# Altium schematic symbol library con-garry (Version 2).SCHLIB: 610 symbols (part 10 of 21)

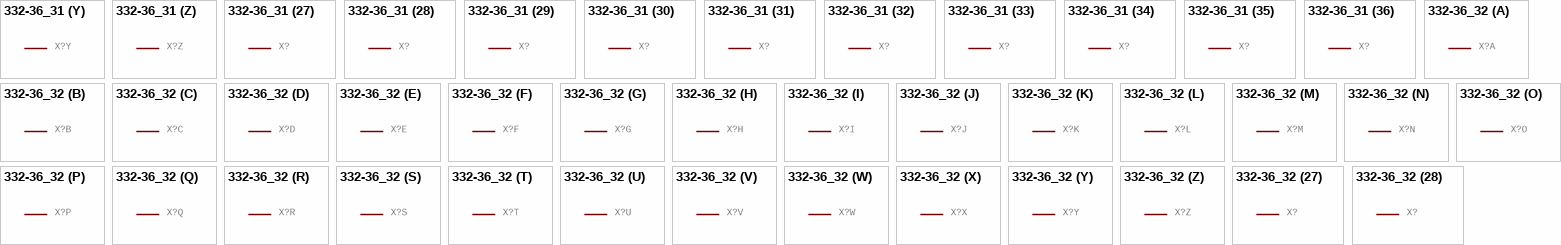
[diagram p207: symbols 332-36_31 to 332-36_32]

## 332-36_31
designator X?, comment 36 Pin - 2mm Dual Row   Source: www.mpe-connector.de / garry_shortform_2012.pdf  (value not drawn)
GateName_1: -1; SymbolName_1: MV; GateName_2: -2; GateName_3: -3; SymbolName_3: M; GateName_4: -4; GateName_5: -5; GateName_6: -6; GateName_7: -7; GateName_8: -8; GateName_9: -9; GateName_10: -10; GateName_11: -11; GateName_12: -12; GateName_13: -13; GateName_14: -14; GateName_15: -15; GateName_16: -16; GateName_17: -17; GateName_18: -18; GateName_19: -19; GateName_20: -20; GateName_21: -21; GateName_22: -22; GateName_23: -23; GateName_24: -24; GateName_25: -25; GateName_26: -26; GateName_27: -27; GateName_28: -28; GateName_29: -29; GateName_30: -30; GateName_31: -31; GateName_32: -32; GateName_33: -33; GateName_34: -34; GateName_35: -35; GateName_36: -36; DeviceSetName: 332-36; POPULARITY: 0; SymbolName_2: MV; SymbolName_4: M; SymbolName_5: M; SymbolName_6: M; SymbolName_7: M; SymbolName_8: M; SymbolName_9: M; SymbolName_10: M; SymbolName_11: M; SymbolName_12: M; SymbolName_13: M; SymbolName_14: M; SymbolName_15: M; SymbolName_16: M; SymbolName_17: M; SymbolName_18: M; SymbolName_19: M; SymbolName_20: M; SymbolName_21: M; SymbolName_22: M; SymbolName_23: M; SymbolName_24: M; SymbolName_25: M; SymbolName_26: M; SymbolName_27: M; SymbolName_28: M; SymbolName_29: M; SymbolName_30: M; SymbolName_31: M; SymbolName_32: M; SymbolName_33: M; SymbolName_34: M; SymbolName_35: M; SymbolName_36: M; LibraryName: con-garry (Version 2); Package: 332-36
footprint 332-36
part A pins: 1 S
part B pins: 2 S
part C pins: 3 S
part D pins: 4 S
part E pins: 5 S
part F pins: 6 S
part G pins: 7 S
part H pins: 8 S
part I pins: 9 S
part J pins: 10 S
part K pins: 11 S
part L pins: 12 S
part M pins: 13 S
part N pins: 14 S
part O pins: 15 S
part P pins: 16 S
part Q pins: 17 S
part R pins: 18 S
part S pins: 19 S
part T pins: 20 S
part U pins: 21 S
part V pins: 22 S
part W pins: 23 S
part X pins: 24 S
part Y pins: 25 S
part Z pins: 26 S
part 27 pins: 27 S
part 28 pins: 28 S
part 29 pins: 29 S
part 30 pins: 30 S
part 31 pins: 31 S
part 32 pins: 32 S
part 33 pins: 33 S
part 34 pins: 34 S
part 35 pins: 35 S
part 36 pins: 36 S

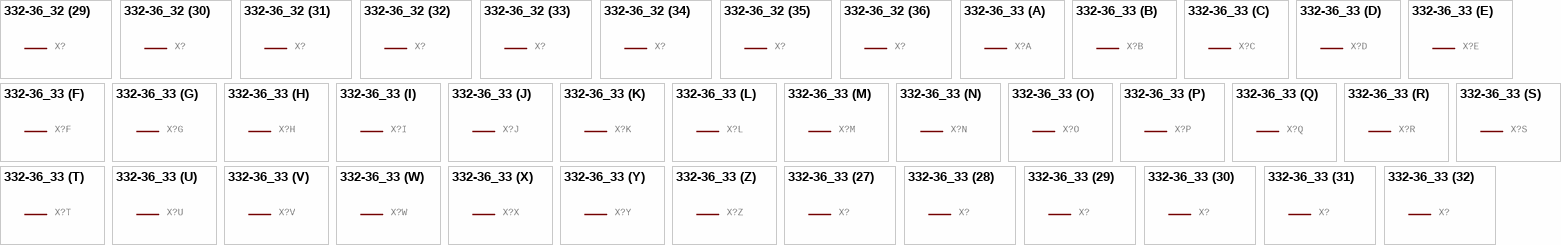
[diagram p208: symbols 332-36_32 to 332-36_33]

## 332-36_32
designator X?, comment 36 Pin - 2mm Dual Row   Source: www.mpe-connector.de / garry_shortform_2012.pdf  (value not drawn)
GateName_1: -1; SymbolName_1: MV; GateName_2: -2; GateName_3: -3; SymbolName_3: M; GateName_4: -4; GateName_5: -5; GateName_6: -6; GateName_7: -7; GateName_8: -8; GateName_9: -9; GateName_10: -10; GateName_11: -11; GateName_12: -12; GateName_13: -13; GateName_14: -14; GateName_15: -15; GateName_16: -16; GateName_17: -17; GateName_18: -18; GateName_19: -19; GateName_20: -20; GateName_21: -21; GateName_22: -22; GateName_23: -23; GateName_24: -24; GateName_25: -25; GateName_26: -26; GateName_27: -27; GateName_28: -28; GateName_29: -29; GateName_30: -30; GateName_31: -31; GateName_32: -32; GateName_33: -33; GateName_34: -34; GateName_35: -35; GateName_36: -36; DeviceSetName: 332-36; POPULARITY: 0; SymbolName_2: MV; SymbolName_4: M; SymbolName_5: M; SymbolName_6: M; SymbolName_7: M; SymbolName_8: M; SymbolName_9: M; SymbolName_10: M; SymbolName_11: M; SymbolName_12: M; SymbolName_13: M; SymbolName_14: M; SymbolName_15: M; SymbolName_16: M; SymbolName_17: M; SymbolName_18: M; SymbolName_19: M; SymbolName_20: M; SymbolName_21: M; SymbolName_22: M; SymbolName_23: M; SymbolName_24: M; SymbolName_25: M; SymbolName_26: M; SymbolName_27: M; SymbolName_28: M; SymbolName_29: M; SymbolName_30: M; SymbolName_31: M; SymbolName_32: M; SymbolName_33: M; SymbolName_34: M; SymbolName_35: M; SymbolName_36: M; LibraryName: con-garry (Version 2); Package: 332-36
footprint 332-36
part A pins: 1 S
part B pins: 2 S
part C pins: 3 S
part D pins: 4 S
part E pins: 5 S
part F pins: 6 S
part G pins: 7 S
part H pins: 8 S
part I pins: 9 S
part J pins: 10 S
part K pins: 11 S
part L pins: 12 S
part M pins: 13 S
part N pins: 14 S
part O pins: 15 S
part P pins: 16 S
part Q pins: 17 S
part R pins: 18 S
part S pins: 19 S
part T pins: 20 S
part U pins: 21 S
part V pins: 22 S
part W pins: 23 S
part X pins: 24 S
part Y pins: 25 S
part Z pins: 26 S
part 27 pins: 27 S
part 28 pins: 28 S
part 29 pins: 29 S
part 30 pins: 30 S
part 31 pins: 31 S
part 32 pins: 32 S
part 33 pins: 33 S
part 34 pins: 34 S
part 35 pins: 35 S
part 36 pins: 36 S

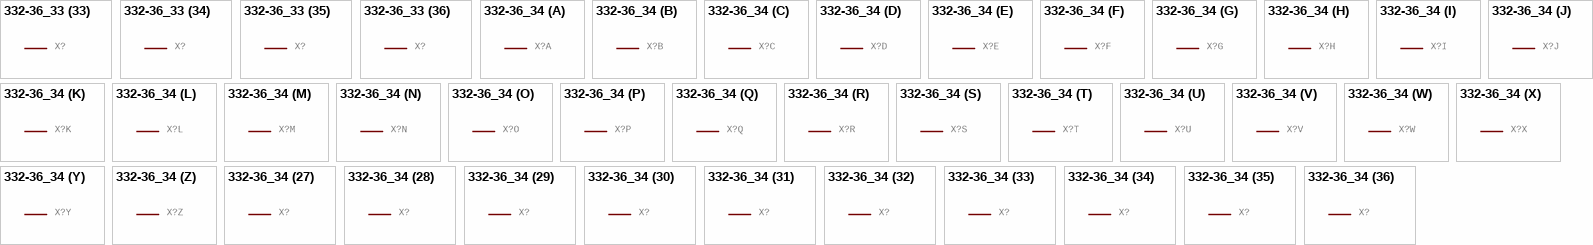
[diagram p209: symbols 332-36_33 to 332-36_34]

## 332-36_33
designator X?, comment 36 Pin - 2mm Dual Row   Source: www.mpe-connector.de / garry_shortform_2012.pdf  (value not drawn)
GateName_1: -1; SymbolName_1: MV; GateName_2: -2; GateName_3: -3; SymbolName_3: M; GateName_4: -4; GateName_5: -5; GateName_6: -6; GateName_7: -7; GateName_8: -8; GateName_9: -9; GateName_10: -10; GateName_11: -11; GateName_12: -12; GateName_13: -13; GateName_14: -14; GateName_15: -15; GateName_16: -16; GateName_17: -17; GateName_18: -18; GateName_19: -19; GateName_20: -20; GateName_21: -21; GateName_22: -22; GateName_23: -23; GateName_24: -24; GateName_25: -25; GateName_26: -26; GateName_27: -27; GateName_28: -28; GateName_29: -29; GateName_30: -30; GateName_31: -31; GateName_32: -32; GateName_33: -33; GateName_34: -34; GateName_35: -35; GateName_36: -36; DeviceSetName: 332-36; POPULARITY: 0; SymbolName_2: MV; SymbolName_4: M; SymbolName_5: M; SymbolName_6: M; SymbolName_7: M; SymbolName_8: M; SymbolName_9: M; SymbolName_10: M; SymbolName_11: M; SymbolName_12: M; SymbolName_13: M; SymbolName_14: M; SymbolName_15: M; SymbolName_16: M; SymbolName_17: M; SymbolName_18: M; SymbolName_19: M; SymbolName_20: M; SymbolName_21: M; SymbolName_22: M; SymbolName_23: M; SymbolName_24: M; SymbolName_25: M; SymbolName_26: M; SymbolName_27: M; SymbolName_28: M; SymbolName_29: M; SymbolName_30: M; SymbolName_31: M; SymbolName_32: M; SymbolName_33: M; SymbolName_34: M; SymbolName_35: M; SymbolName_36: M; LibraryName: con-garry (Version 2); Package: 332-36
footprint 332-36
part A pins: 1 S
part B pins: 2 S
part C pins: 3 S
part D pins: 4 S
part E pins: 5 S
part F pins: 6 S
part G pins: 7 S
part H pins: 8 S
part I pins: 9 S
part J pins: 10 S
part K pins: 11 S
part L pins: 12 S
part M pins: 13 S
part N pins: 14 S
part O pins: 15 S
part P pins: 16 S
part Q pins: 17 S
part R pins: 18 S
part S pins: 19 S
part T pins: 20 S
part U pins: 21 S
part V pins: 22 S
part W pins: 23 S
part X pins: 24 S
part Y pins: 25 S
part Z pins: 26 S
part 27 pins: 27 S
part 28 pins: 28 S
part 29 pins: 29 S
part 30 pins: 30 S
part 31 pins: 31 S
part 32 pins: 32 S
part 33 pins: 33 S
part 34 pins: 34 S
part 35 pins: 35 S
part 36 pins: 36 S

## 332-36_34
designator X?, comment 36 Pin - 2mm Dual Row   Source: www.mpe-connector.de / garry_shortform_2012.pdf  (value not drawn)
GateName_1: -1; SymbolName_1: MV; GateName_2: -2; GateName_3: -3; SymbolName_3: M; GateName_4: -4; GateName_5: -5; GateName_6: -6; GateName_7: -7; GateName_8: -8; GateName_9: -9; GateName_10: -10; GateName_11: -11; GateName_12: -12; GateName_13: -13; GateName_14: -14; GateName_15: -15; GateName_16: -16; GateName_17: -17; GateName_18: -18; GateName_19: -19; GateName_20: -20; GateName_21: -21; GateName_22: -22; GateName_23: -23; GateName_24: -24; GateName_25: -25; GateName_26: -26; GateName_27: -27; GateName_28: -28; GateName_29: -29; GateName_30: -30; GateName_31: -31; GateName_32: -32; GateName_33: -33; GateName_34: -34; GateName_35: -35; GateName_36: -36; DeviceSetName: 332-36; POPULARITY: 0; SymbolName_2: MV; SymbolName_4: M; SymbolName_5: M; SymbolName_6: M; SymbolName_7: M; SymbolName_8: M; SymbolName_9: M; SymbolName_10: M; SymbolName_11: M; SymbolName_12: M; SymbolName_13: M; SymbolName_14: M; SymbolName_15: M; SymbolName_16: M; SymbolName_17: M; SymbolName_18: M; SymbolName_19: M; SymbolName_20: M; SymbolName_21: M; SymbolName_22: M; SymbolName_23: M; SymbolName_24: M; SymbolName_25: M; SymbolName_26: M; SymbolName_27: M; SymbolName_28: M; SymbolName_29: M; SymbolName_30: M; SymbolName_31: M; SymbolName_32: M; SymbolName_33: M; SymbolName_34: M; SymbolName_35: M; SymbolName_36: M; LibraryName: con-garry (Version 2); Package: 332-36
footprint 332-36
part A pins: 1 S
part B pins: 2 S
part C pins: 3 S
part D pins: 4 S
part E pins: 5 S
part F pins: 6 S
part G pins: 7 S
part H pins: 8 S
part I pins: 9 S
part J pins: 10 S
part K pins: 11 S
part L pins: 12 S
part M pins: 13 S
part N pins: 14 S
part O pins: 15 S
part P pins: 16 S
part Q pins: 17 S
part R pins: 18 S
part S pins: 19 S
part T pins: 20 S
part U pins: 21 S
part V pins: 22 S
part W pins: 23 S
part X pins: 24 S
part Y pins: 25 S
part Z pins: 26 S
part 27 pins: 27 S
part 28 pins: 28 S
part 29 pins: 29 S
part 30 pins: 30 S
part 31 pins: 31 S
part 32 pins: 32 S
part 33 pins: 33 S
part 34 pins: 34 S
part 35 pins: 35 S
part 36 pins: 36 S

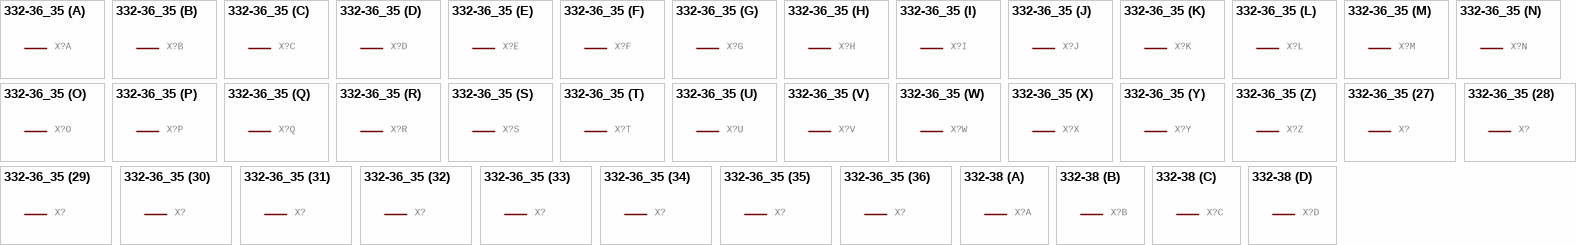
[diagram p210: symbols 332-36_35 to 332-38]

## 332-36_35
designator X?, comment 36 Pin - 2mm Dual Row   Source: www.mpe-connector.de / garry_shortform_2012.pdf  (value not drawn)
GateName_1: -1; SymbolName_1: MV; GateName_2: -2; GateName_3: -3; SymbolName_3: M; GateName_4: -4; GateName_5: -5; GateName_6: -6; GateName_7: -7; GateName_8: -8; GateName_9: -9; GateName_10: -10; GateName_11: -11; GateName_12: -12; GateName_13: -13; GateName_14: -14; GateName_15: -15; GateName_16: -16; GateName_17: -17; GateName_18: -18; GateName_19: -19; GateName_20: -20; GateName_21: -21; GateName_22: -22; GateName_23: -23; GateName_24: -24; GateName_25: -25; GateName_26: -26; GateName_27: -27; GateName_28: -28; GateName_29: -29; GateName_30: -30; GateName_31: -31; GateName_32: -32; GateName_33: -33; GateName_34: -34; GateName_35: -35; GateName_36: -36; DeviceSetName: 332-36; POPULARITY: 0; SymbolName_2: MV; SymbolName_4: M; SymbolName_5: M; SymbolName_6: M; SymbolName_7: M; SymbolName_8: M; SymbolName_9: M; SymbolName_10: M; SymbolName_11: M; SymbolName_12: M; SymbolName_13: M; SymbolName_14: M; SymbolName_15: M; SymbolName_16: M; SymbolName_17: M; SymbolName_18: M; SymbolName_19: M; SymbolName_20: M; SymbolName_21: M; SymbolName_22: M; SymbolName_23: M; SymbolName_24: M; SymbolName_25: M; SymbolName_26: M; SymbolName_27: M; SymbolName_28: M; SymbolName_29: M; SymbolName_30: M; SymbolName_31: M; SymbolName_32: M; SymbolName_33: M; SymbolName_34: M; SymbolName_35: M; SymbolName_36: M; LibraryName: con-garry (Version 2); Package: 332-36
footprint 332-36
part A pins: 1 S
part B pins: 2 S
part C pins: 3 S
part D pins: 4 S
part E pins: 5 S
part F pins: 6 S
part G pins: 7 S
part H pins: 8 S
part I pins: 9 S
part J pins: 10 S
part K pins: 11 S
part L pins: 12 S
part M pins: 13 S
part N pins: 14 S
part O pins: 15 S
part P pins: 16 S
part Q pins: 17 S
part R pins: 18 S
part S pins: 19 S
part T pins: 20 S
part U pins: 21 S
part V pins: 22 S
part W pins: 23 S
part X pins: 24 S
part Y pins: 25 S
part Z pins: 26 S
part 27 pins: 27 S
part 28 pins: 28 S
part 29 pins: 29 S
part 30 pins: 30 S
part 31 pins: 31 S
part 32 pins: 32 S
part 33 pins: 33 S
part 34 pins: 34 S
part 35 pins: 35 S
part 36 pins: 36 S

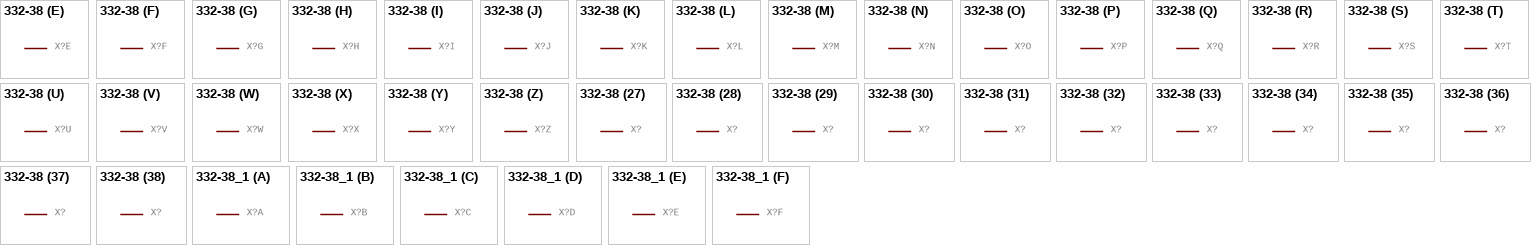
[diagram p211: symbols 332-38 to 332-38_1]

## 332-38
designator X?, comment 38 Pin - 2mm Dual Row   Source: www.mpe-connector.de / garry_shortform_2012.pdf  (value not drawn)
GateName_1: -1; SymbolName_1: MV; GateName_2: -2; GateName_3: -3; SymbolName_3: M; GateName_4: -4; GateName_5: -5; GateName_6: -6; GateName_7: -7; GateName_8: -8; GateName_9: -9; GateName_10: -10; GateName_11: -11; GateName_12: -12; GateName_13: -13; GateName_14: -14; GateName_15: -15; GateName_16: -16; GateName_17: -17; GateName_18: -18; GateName_19: -19; GateName_20: -20; GateName_21: -21; GateName_22: -22; GateName_23: -23; GateName_24: -24; GateName_25: -25; GateName_26: -26; GateName_27: -27; GateName_28: -28; GateName_29: -29; GateName_30: -30; GateName_31: -31; GateName_32: -32; GateName_33: -33; GateName_34: -34; GateName_35: -35; GateName_36: -36; GateName_37: -37; GateName_38: -38; DeviceSetName: 332-38; POPULARITY: 0; SymbolName_2: MV; SymbolName_4: M; SymbolName_5: M; SymbolName_6: M; SymbolName_7: M; SymbolName_8: M; SymbolName_9: M; SymbolName_10: M; SymbolName_11: M; SymbolName_12: M; SymbolName_13: M; SymbolName_14: M; SymbolName_15: M; SymbolName_16: M; SymbolName_17: M; SymbolName_18: M; SymbolName_19: M; SymbolName_20: M; SymbolName_21: M; SymbolName_22: M; SymbolName_23: M; SymbolName_24: M; SymbolName_25: M; SymbolName_26: M; SymbolName_27: M; SymbolName_28: M; SymbolName_29: M; SymbolName_30: M; SymbolName_31: M; SymbolName_32: M; SymbolName_33: M; SymbolName_34: M; SymbolName_35: M; SymbolName_36: M; SymbolName_37: M; SymbolName_38: M; LibraryName: con-garry (Version 2); Package: 332-38
footprint 332-38
part A pins: 1 S
part B pins: 2 S
part C pins: 3 S
part D pins: 4 S
part E pins: 5 S
part F pins: 6 S
part G pins: 7 S
part H pins: 8 S
part I pins: 9 S
part J pins: 10 S
part K pins: 11 S
part L pins: 12 S
part M pins: 13 S
part N pins: 14 S
part O pins: 15 S
part P pins: 16 S
part Q pins: 17 S
part R pins: 18 S
part S pins: 19 S
part T pins: 20 S
part U pins: 21 S
part V pins: 22 S
part W pins: 23 S
part X pins: 24 S
part Y pins: 25 S
part Z pins: 26 S
part 27 pins: 27 S
part 28 pins: 28 S
part 29 pins: 29 S
part 30 pins: 30 S
part 31 pins: 31 S
part 32 pins: 32 S
part 33 pins: 33 S
part 34 pins: 34 S
part 35 pins: 35 S
part 36 pins: 36 S
part 37 pins: 37 S
part 38 pins: 38 S

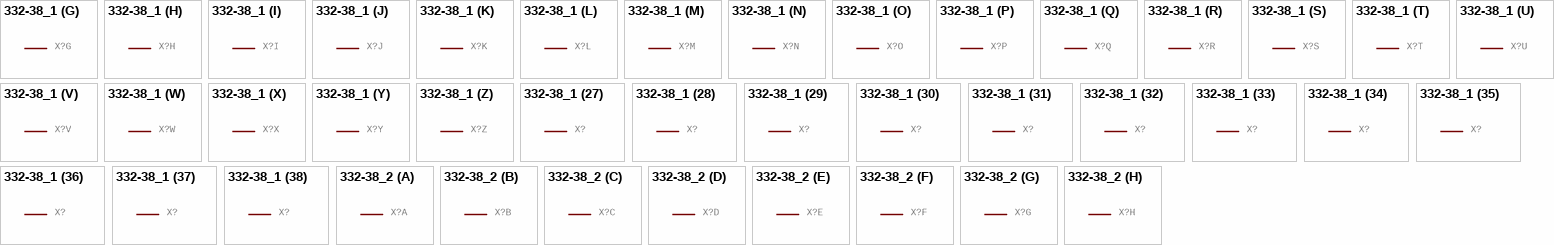
[diagram p212: symbols 332-38_1 to 332-38_2]

## 332-38_1
designator X?, comment 38 Pin - 2mm Dual Row   Source: www.mpe-connector.de / garry_shortform_2012.pdf  (value not drawn)
GateName_1: -1; SymbolName_1: MV; GateName_2: -2; GateName_3: -3; SymbolName_3: M; GateName_4: -4; GateName_5: -5; GateName_6: -6; GateName_7: -7; GateName_8: -8; GateName_9: -9; GateName_10: -10; GateName_11: -11; GateName_12: -12; GateName_13: -13; GateName_14: -14; GateName_15: -15; GateName_16: -16; GateName_17: -17; GateName_18: -18; GateName_19: -19; GateName_20: -20; GateName_21: -21; GateName_22: -22; GateName_23: -23; GateName_24: -24; GateName_25: -25; GateName_26: -26; GateName_27: -27; GateName_28: -28; GateName_29: -29; GateName_30: -30; GateName_31: -31; GateName_32: -32; GateName_33: -33; GateName_34: -34; GateName_35: -35; GateName_36: -36; GateName_37: -37; GateName_38: -38; DeviceSetName: 332-38; POPULARITY: 0; SymbolName_2: MV; SymbolName_4: M; SymbolName_5: M; SymbolName_6: M; SymbolName_7: M; SymbolName_8: M; SymbolName_9: M; SymbolName_10: M; SymbolName_11: M; SymbolName_12: M; SymbolName_13: M; SymbolName_14: M; SymbolName_15: M; SymbolName_16: M; SymbolName_17: M; SymbolName_18: M; SymbolName_19: M; SymbolName_20: M; SymbolName_21: M; SymbolName_22: M; SymbolName_23: M; SymbolName_24: M; SymbolName_25: M; SymbolName_26: M; SymbolName_27: M; SymbolName_28: M; SymbolName_29: M; SymbolName_30: M; SymbolName_31: M; SymbolName_32: M; SymbolName_33: M; SymbolName_34: M; SymbolName_35: M; SymbolName_36: M; SymbolName_37: M; SymbolName_38: M; LibraryName: con-garry (Version 2); Package: 332-38
footprint 332-38
part A pins: 1 S
part B pins: 2 S
part C pins: 3 S
part D pins: 4 S
part E pins: 5 S
part F pins: 6 S
part G pins: 7 S
part H pins: 8 S
part I pins: 9 S
part J pins: 10 S
part K pins: 11 S
part L pins: 12 S
part M pins: 13 S
part N pins: 14 S
part O pins: 15 S
part P pins: 16 S
part Q pins: 17 S
part R pins: 18 S
part S pins: 19 S
part T pins: 20 S
part U pins: 21 S
part V pins: 22 S
part W pins: 23 S
part X pins: 24 S
part Y pins: 25 S
part Z pins: 26 S
part 27 pins: 27 S
part 28 pins: 28 S
part 29 pins: 29 S
part 30 pins: 30 S
part 31 pins: 31 S
part 32 pins: 32 S
part 33 pins: 33 S
part 34 pins: 34 S
part 35 pins: 35 S
part 36 pins: 36 S
part 37 pins: 37 S
part 38 pins: 38 S

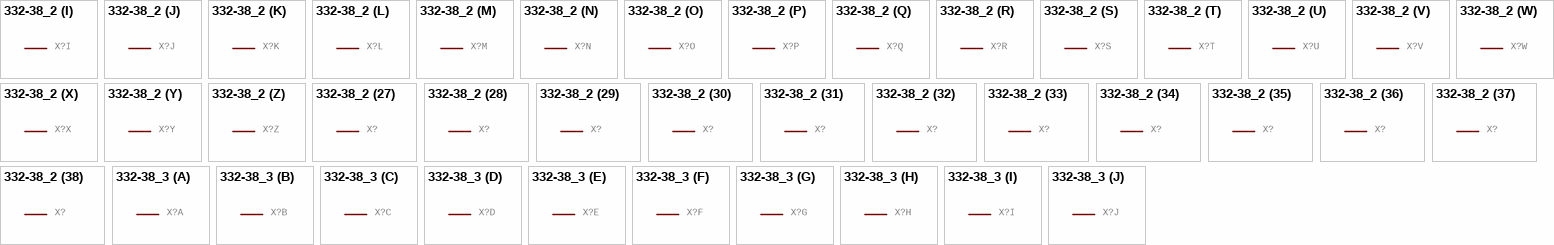
[diagram p213: symbols 332-38_2 to 332-38_3]

## 332-38_2
designator X?, comment 38 Pin - 2mm Dual Row   Source: www.mpe-connector.de / garry_shortform_2012.pdf  (value not drawn)
GateName_1: -1; SymbolName_1: MV; GateName_2: -2; GateName_3: -3; SymbolName_3: M; GateName_4: -4; GateName_5: -5; GateName_6: -6; GateName_7: -7; GateName_8: -8; GateName_9: -9; GateName_10: -10; GateName_11: -11; GateName_12: -12; GateName_13: -13; GateName_14: -14; GateName_15: -15; GateName_16: -16; GateName_17: -17; GateName_18: -18; GateName_19: -19; GateName_20: -20; GateName_21: -21; GateName_22: -22; GateName_23: -23; GateName_24: -24; GateName_25: -25; GateName_26: -26; GateName_27: -27; GateName_28: -28; GateName_29: -29; GateName_30: -30; GateName_31: -31; GateName_32: -32; GateName_33: -33; GateName_34: -34; GateName_35: -35; GateName_36: -36; GateName_37: -37; GateName_38: -38; DeviceSetName: 332-38; POPULARITY: 0; SymbolName_2: MV; SymbolName_4: M; SymbolName_5: M; SymbolName_6: M; SymbolName_7: M; SymbolName_8: M; SymbolName_9: M; SymbolName_10: M; SymbolName_11: M; SymbolName_12: M; SymbolName_13: M; SymbolName_14: M; SymbolName_15: M; SymbolName_16: M; SymbolName_17: M; SymbolName_18: M; SymbolName_19: M; SymbolName_20: M; SymbolName_21: M; SymbolName_22: M; SymbolName_23: M; SymbolName_24: M; SymbolName_25: M; SymbolName_26: M; SymbolName_27: M; SymbolName_28: M; SymbolName_29: M; SymbolName_30: M; SymbolName_31: M; SymbolName_32: M; SymbolName_33: M; SymbolName_34: M; SymbolName_35: M; SymbolName_36: M; SymbolName_37: M; SymbolName_38: M; LibraryName: con-garry (Version 2); Package: 332-38
footprint 332-38
part A pins: 1 S
part B pins: 2 S
part C pins: 3 S
part D pins: 4 S
part E pins: 5 S
part F pins: 6 S
part G pins: 7 S
part H pins: 8 S
part I pins: 9 S
part J pins: 10 S
part K pins: 11 S
part L pins: 12 S
part M pins: 13 S
part N pins: 14 S
part O pins: 15 S
part P pins: 16 S
part Q pins: 17 S
part R pins: 18 S
part S pins: 19 S
part T pins: 20 S
part U pins: 21 S
part V pins: 22 S
part W pins: 23 S
part X pins: 24 S
part Y pins: 25 S
part Z pins: 26 S
part 27 pins: 27 S
part 28 pins: 28 S
part 29 pins: 29 S
part 30 pins: 30 S
part 31 pins: 31 S
part 32 pins: 32 S
part 33 pins: 33 S
part 34 pins: 34 S
part 35 pins: 35 S
part 36 pins: 36 S
part 37 pins: 37 S
part 38 pins: 38 S

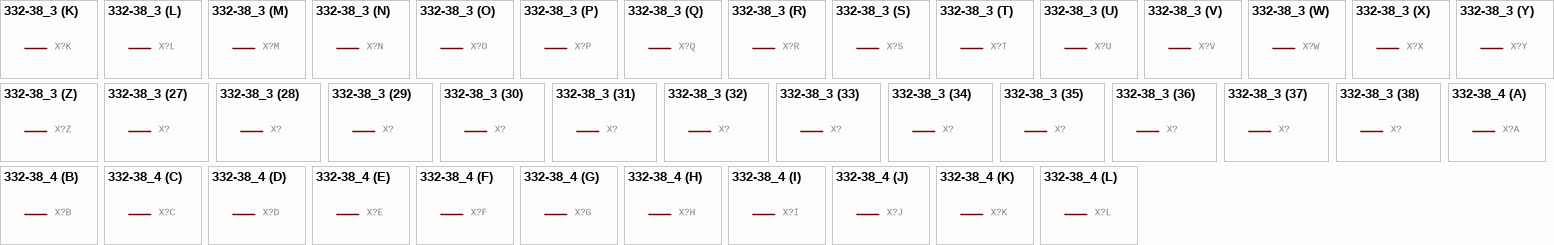
[diagram p214: symbols 332-38_3 to 332-38_4]

## 332-38_3
designator X?, comment 38 Pin - 2mm Dual Row   Source: www.mpe-connector.de / garry_shortform_2012.pdf  (value not drawn)
GateName_1: -1; SymbolName_1: MV; GateName_2: -2; GateName_3: -3; SymbolName_3: M; GateName_4: -4; GateName_5: -5; GateName_6: -6; GateName_7: -7; GateName_8: -8; GateName_9: -9; GateName_10: -10; GateName_11: -11; GateName_12: -12; GateName_13: -13; GateName_14: -14; GateName_15: -15; GateName_16: -16; GateName_17: -17; GateName_18: -18; GateName_19: -19; GateName_20: -20; GateName_21: -21; GateName_22: -22; GateName_23: -23; GateName_24: -24; GateName_25: -25; GateName_26: -26; GateName_27: -27; GateName_28: -28; GateName_29: -29; GateName_30: -30; GateName_31: -31; GateName_32: -32; GateName_33: -33; GateName_34: -34; GateName_35: -35; GateName_36: -36; GateName_37: -37; GateName_38: -38; DeviceSetName: 332-38; POPULARITY: 0; SymbolName_2: MV; SymbolName_4: M; SymbolName_5: M; SymbolName_6: M; SymbolName_7: M; SymbolName_8: M; SymbolName_9: M; SymbolName_10: M; SymbolName_11: M; SymbolName_12: M; SymbolName_13: M; SymbolName_14: M; SymbolName_15: M; SymbolName_16: M; SymbolName_17: M; SymbolName_18: M; SymbolName_19: M; SymbolName_20: M; SymbolName_21: M; SymbolName_22: M; SymbolName_23: M; SymbolName_24: M; SymbolName_25: M; SymbolName_26: M; SymbolName_27: M; SymbolName_28: M; SymbolName_29: M; SymbolName_30: M; SymbolName_31: M; SymbolName_32: M; SymbolName_33: M; SymbolName_34: M; SymbolName_35: M; SymbolName_36: M; SymbolName_37: M; SymbolName_38: M; LibraryName: con-garry (Version 2); Package: 332-38
footprint 332-38
part A pins: 1 S
part B pins: 2 S
part C pins: 3 S
part D pins: 4 S
part E pins: 5 S
part F pins: 6 S
part G pins: 7 S
part H pins: 8 S
part I pins: 9 S
part J pins: 10 S
part K pins: 11 S
part L pins: 12 S
part M pins: 13 S
part N pins: 14 S
part O pins: 15 S
part P pins: 16 S
part Q pins: 17 S
part R pins: 18 S
part S pins: 19 S
part T pins: 20 S
part U pins: 21 S
part V pins: 22 S
part W pins: 23 S
part X pins: 24 S
part Y pins: 25 S
part Z pins: 26 S
part 27 pins: 27 S
part 28 pins: 28 S
part 29 pins: 29 S
part 30 pins: 30 S
part 31 pins: 31 S
part 32 pins: 32 S
part 33 pins: 33 S
part 34 pins: 34 S
part 35 pins: 35 S
part 36 pins: 36 S
part 37 pins: 37 S
part 38 pins: 38 S

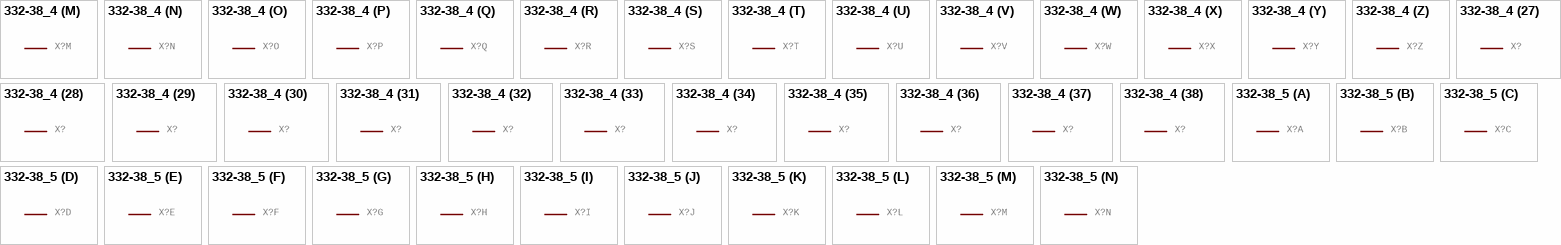
[diagram p215: symbols 332-38_4 to 332-38_5]

## 332-38_4
designator X?, comment 38 Pin - 2mm Dual Row   Source: www.mpe-connector.de / garry_shortform_2012.pdf  (value not drawn)
GateName_1: -1; SymbolName_1: MV; GateName_2: -2; GateName_3: -3; SymbolName_3: M; GateName_4: -4; GateName_5: -5; GateName_6: -6; GateName_7: -7; GateName_8: -8; GateName_9: -9; GateName_10: -10; GateName_11: -11; GateName_12: -12; GateName_13: -13; GateName_14: -14; GateName_15: -15; GateName_16: -16; GateName_17: -17; GateName_18: -18; GateName_19: -19; GateName_20: -20; GateName_21: -21; GateName_22: -22; GateName_23: -23; GateName_24: -24; GateName_25: -25; GateName_26: -26; GateName_27: -27; GateName_28: -28; GateName_29: -29; GateName_30: -30; GateName_31: -31; GateName_32: -32; GateName_33: -33; GateName_34: -34; GateName_35: -35; GateName_36: -36; GateName_37: -37; GateName_38: -38; DeviceSetName: 332-38; POPULARITY: 0; SymbolName_2: MV; SymbolName_4: M; SymbolName_5: M; SymbolName_6: M; SymbolName_7: M; SymbolName_8: M; SymbolName_9: M; SymbolName_10: M; SymbolName_11: M; SymbolName_12: M; SymbolName_13: M; SymbolName_14: M; SymbolName_15: M; SymbolName_16: M; SymbolName_17: M; SymbolName_18: M; SymbolName_19: M; SymbolName_20: M; SymbolName_21: M; SymbolName_22: M; SymbolName_23: M; SymbolName_24: M; SymbolName_25: M; SymbolName_26: M; SymbolName_27: M; SymbolName_28: M; SymbolName_29: M; SymbolName_30: M; SymbolName_31: M; SymbolName_32: M; SymbolName_33: M; SymbolName_34: M; SymbolName_35: M; SymbolName_36: M; SymbolName_37: M; SymbolName_38: M; LibraryName: con-garry (Version 2); Package: 332-38
footprint 332-38
part A pins: 1 S
part B pins: 2 S
part C pins: 3 S
part D pins: 4 S
part E pins: 5 S
part F pins: 6 S
part G pins: 7 S
part H pins: 8 S
part I pins: 9 S
part J pins: 10 S
part K pins: 11 S
part L pins: 12 S
part M pins: 13 S
part N pins: 14 S
part O pins: 15 S
part P pins: 16 S
part Q pins: 17 S
part R pins: 18 S
part S pins: 19 S
part T pins: 20 S
part U pins: 21 S
part V pins: 22 S
part W pins: 23 S
part X pins: 24 S
part Y pins: 25 S
part Z pins: 26 S
part 27 pins: 27 S
part 28 pins: 28 S
part 29 pins: 29 S
part 30 pins: 30 S
part 31 pins: 31 S
part 32 pins: 32 S
part 33 pins: 33 S
part 34 pins: 34 S
part 35 pins: 35 S
part 36 pins: 36 S
part 37 pins: 37 S
part 38 pins: 38 S

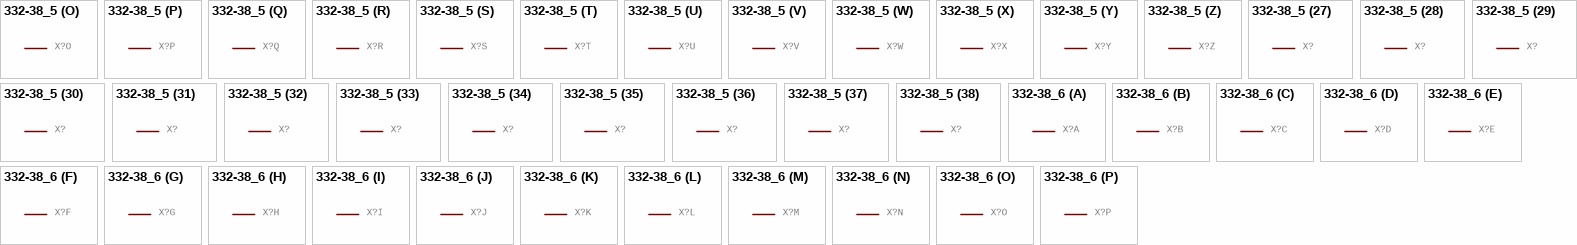
[diagram p216: symbols 332-38_5 to 332-38_6]

## 332-38_5
designator X?, comment 38 Pin - 2mm Dual Row   Source: www.mpe-connector.de / garry_shortform_2012.pdf  (value not drawn)
GateName_1: -1; SymbolName_1: MV; GateName_2: -2; GateName_3: -3; SymbolName_3: M; GateName_4: -4; GateName_5: -5; GateName_6: -6; GateName_7: -7; GateName_8: -8; GateName_9: -9; GateName_10: -10; GateName_11: -11; GateName_12: -12; GateName_13: -13; GateName_14: -14; GateName_15: -15; GateName_16: -16; GateName_17: -17; GateName_18: -18; GateName_19: -19; GateName_20: -20; GateName_21: -21; GateName_22: -22; GateName_23: -23; GateName_24: -24; GateName_25: -25; GateName_26: -26; GateName_27: -27; GateName_28: -28; GateName_29: -29; GateName_30: -30; GateName_31: -31; GateName_32: -32; GateName_33: -33; GateName_34: -34; GateName_35: -35; GateName_36: -36; GateName_37: -37; GateName_38: -38; DeviceSetName: 332-38; POPULARITY: 0; SymbolName_2: MV; SymbolName_4: M; SymbolName_5: M; SymbolName_6: M; SymbolName_7: M; SymbolName_8: M; SymbolName_9: M; SymbolName_10: M; SymbolName_11: M; SymbolName_12: M; SymbolName_13: M; SymbolName_14: M; SymbolName_15: M; SymbolName_16: M; SymbolName_17: M; SymbolName_18: M; SymbolName_19: M; SymbolName_20: M; SymbolName_21: M; SymbolName_22: M; SymbolName_23: M; SymbolName_24: M; SymbolName_25: M; SymbolName_26: M; SymbolName_27: M; SymbolName_28: M; SymbolName_29: M; SymbolName_30: M; SymbolName_31: M; SymbolName_32: M; SymbolName_33: M; SymbolName_34: M; SymbolName_35: M; SymbolName_36: M; SymbolName_37: M; SymbolName_38: M; LibraryName: con-garry (Version 2); Package: 332-38
footprint 332-38
part A pins: 1 S
part B pins: 2 S
part C pins: 3 S
part D pins: 4 S
part E pins: 5 S
part F pins: 6 S
part G pins: 7 S
part H pins: 8 S
part I pins: 9 S
part J pins: 10 S
part K pins: 11 S
part L pins: 12 S
part M pins: 13 S
part N pins: 14 S
part O pins: 15 S
part P pins: 16 S
part Q pins: 17 S
part R pins: 18 S
part S pins: 19 S
part T pins: 20 S
part U pins: 21 S
part V pins: 22 S
part W pins: 23 S
part X pins: 24 S
part Y pins: 25 S
part Z pins: 26 S
part 27 pins: 27 S
part 28 pins: 28 S
part 29 pins: 29 S
part 30 pins: 30 S
part 31 pins: 31 S
part 32 pins: 32 S
part 33 pins: 33 S
part 34 pins: 34 S
part 35 pins: 35 S
part 36 pins: 36 S
part 37 pins: 37 S
part 38 pins: 38 S

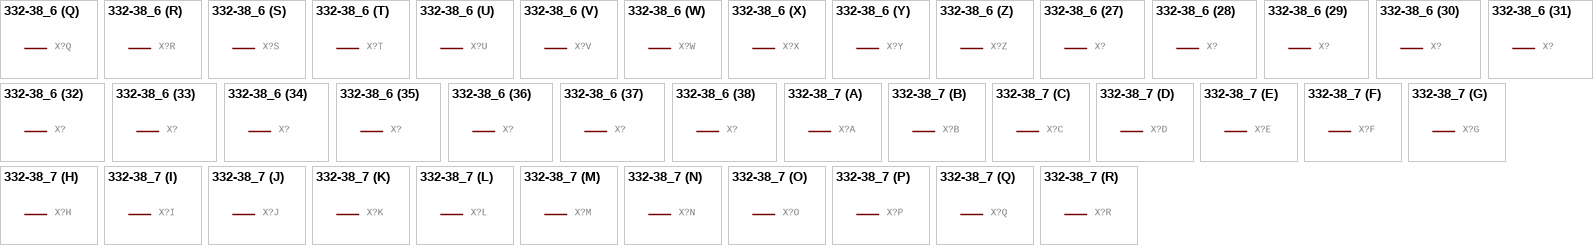
[diagram p217: symbols 332-38_6 to 332-38_7]

## 332-38_6
designator X?, comment 38 Pin - 2mm Dual Row   Source: www.mpe-connector.de / garry_shortform_2012.pdf  (value not drawn)
GateName_1: -1; SymbolName_1: MV; GateName_2: -2; GateName_3: -3; SymbolName_3: M; GateName_4: -4; GateName_5: -5; GateName_6: -6; GateName_7: -7; GateName_8: -8; GateName_9: -9; GateName_10: -10; GateName_11: -11; GateName_12: -12; GateName_13: -13; GateName_14: -14; GateName_15: -15; GateName_16: -16; GateName_17: -17; GateName_18: -18; GateName_19: -19; GateName_20: -20; GateName_21: -21; GateName_22: -22; GateName_23: -23; GateName_24: -24; GateName_25: -25; GateName_26: -26; GateName_27: -27; GateName_28: -28; GateName_29: -29; GateName_30: -30; GateName_31: -31; GateName_32: -32; GateName_33: -33; GateName_34: -34; GateName_35: -35; GateName_36: -36; GateName_37: -37; GateName_38: -38; DeviceSetName: 332-38; POPULARITY: 0; SymbolName_2: MV; SymbolName_4: M; SymbolName_5: M; SymbolName_6: M; SymbolName_7: M; SymbolName_8: M; SymbolName_9: M; SymbolName_10: M; SymbolName_11: M; SymbolName_12: M; SymbolName_13: M; SymbolName_14: M; SymbolName_15: M; SymbolName_16: M; SymbolName_17: M; SymbolName_18: M; SymbolName_19: M; SymbolName_20: M; SymbolName_21: M; SymbolName_22: M; SymbolName_23: M; SymbolName_24: M; SymbolName_25: M; SymbolName_26: M; SymbolName_27: M; SymbolName_28: M; SymbolName_29: M; SymbolName_30: M; SymbolName_31: M; SymbolName_32: M; SymbolName_33: M; SymbolName_34: M; SymbolName_35: M; SymbolName_36: M; SymbolName_37: M; SymbolName_38: M; LibraryName: con-garry (Version 2); Package: 332-38
footprint 332-38
part A pins: 1 S
part B pins: 2 S
part C pins: 3 S
part D pins: 4 S
part E pins: 5 S
part F pins: 6 S
part G pins: 7 S
part H pins: 8 S
part I pins: 9 S
part J pins: 10 S
part K pins: 11 S
part L pins: 12 S
part M pins: 13 S
part N pins: 14 S
part O pins: 15 S
part P pins: 16 S
part Q pins: 17 S
part R pins: 18 S
part S pins: 19 S
part T pins: 20 S
part U pins: 21 S
part V pins: 22 S
part W pins: 23 S
part X pins: 24 S
part Y pins: 25 S
part Z pins: 26 S
part 27 pins: 27 S
part 28 pins: 28 S
part 29 pins: 29 S
part 30 pins: 30 S
part 31 pins: 31 S
part 32 pins: 32 S
part 33 pins: 33 S
part 34 pins: 34 S
part 35 pins: 35 S
part 36 pins: 36 S
part 37 pins: 37 S
part 38 pins: 38 S

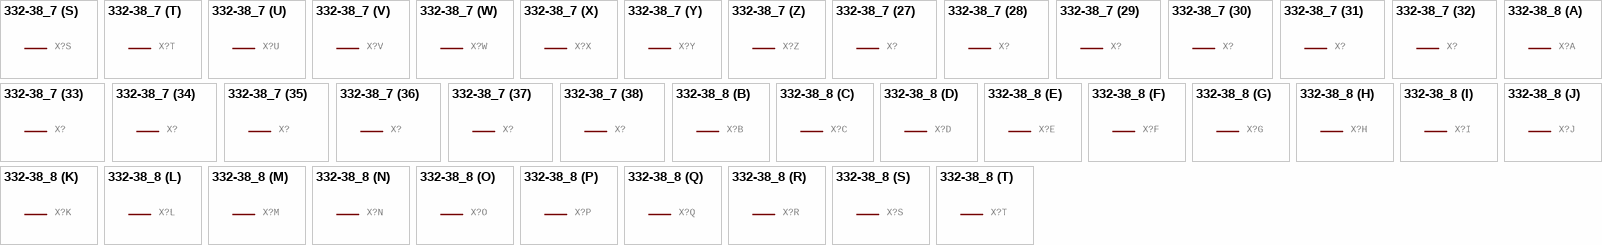
[diagram p218: symbols 332-38_7 to 332-38_8]
